# Altium footprint library SparkFun-Retired.PCBLIB: 302 footprints (part 13 of 19)
Each footprint in its own frame and in the unit in brackets; x right, y up, seen from the top. Pads: shape width x height; smd on the part's side, far side on the other; paste and mask are expansions set on the pad; w line width, h text height; cw(c..) or ccw(c..) is an arc to the next point about the centre after c.
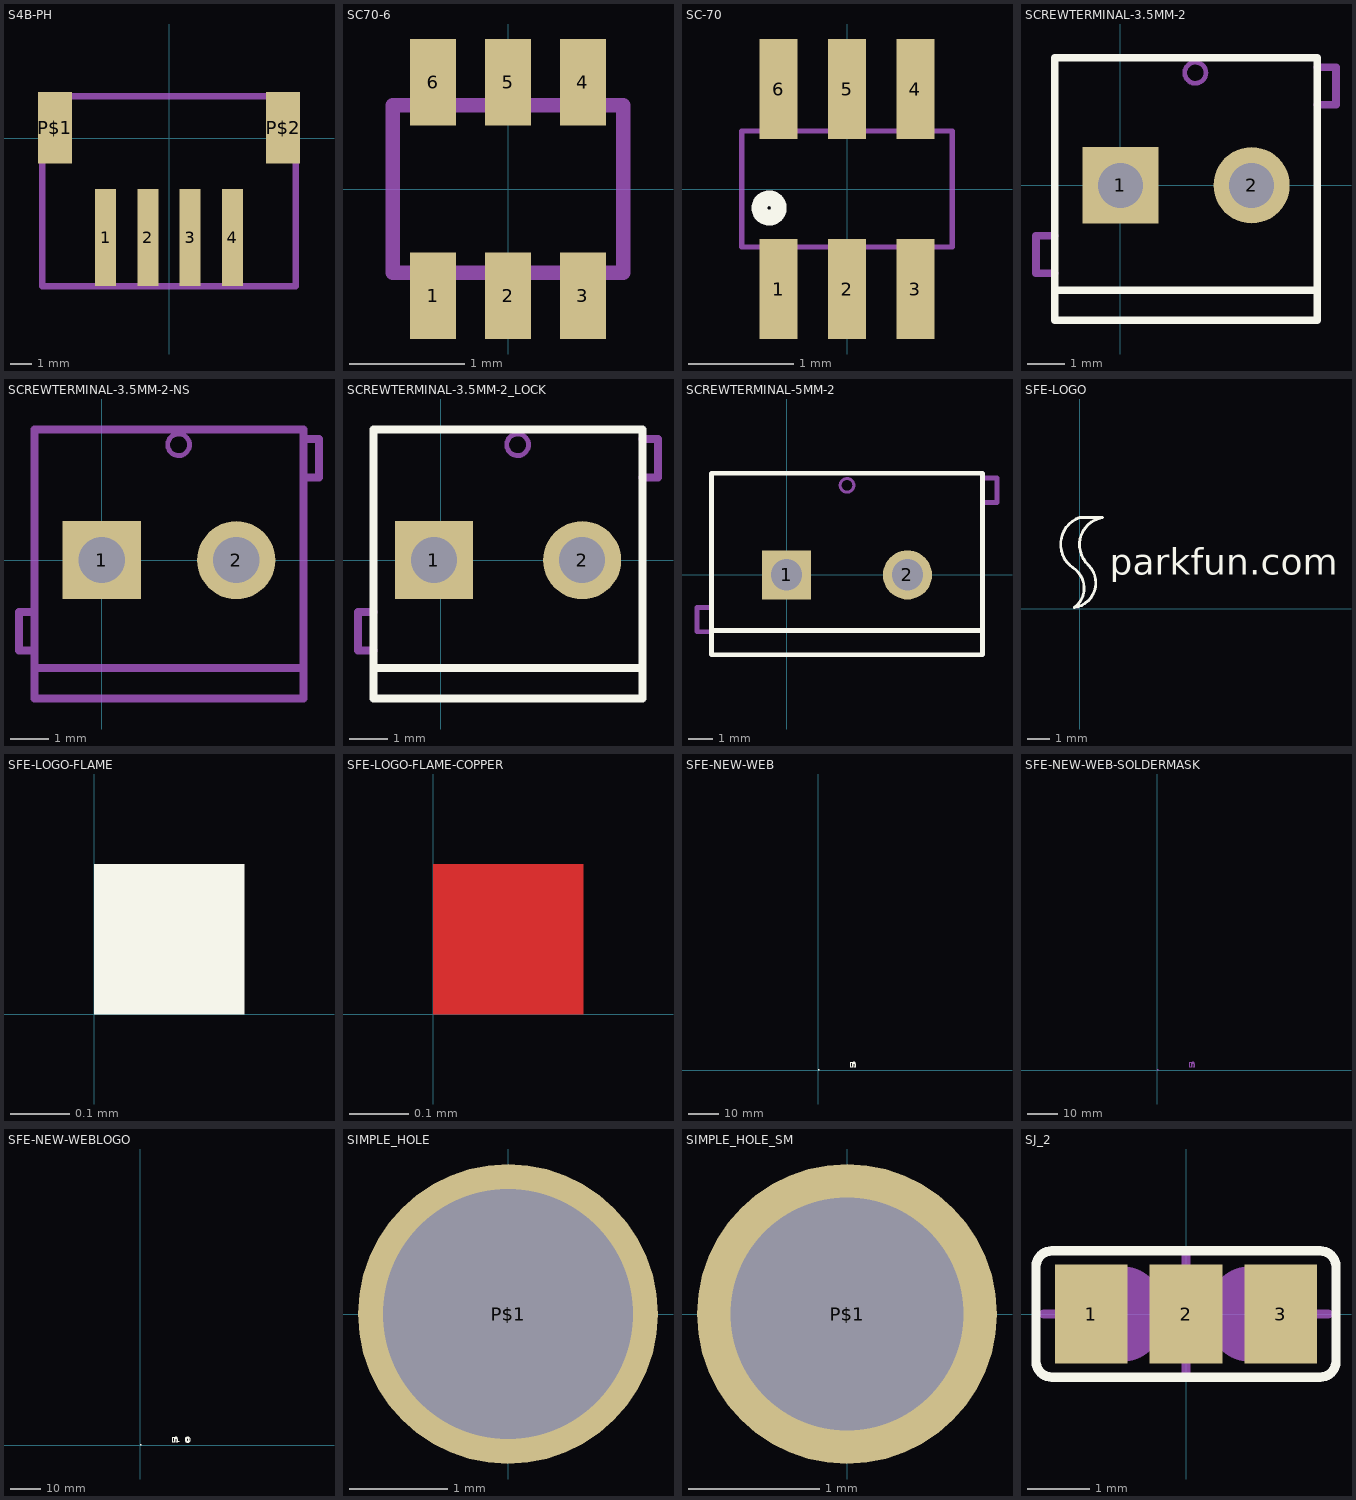
[diagram p12: the footprints below, top view; thin cyan lines are the x and y axes]

## S4B-PH [mm]
pads (6):
  rect 1x4.6 smd: 1(-3,-4.7) 2(-1,-4.7) 3(1,-4.7) 4(3,-4.7)
  rect 1.6x3.4 smd: P$1(-5.4,0.5) P$2(5.4,0.5)
Mechanical 16:
  lines w0.305: -6,-7 -6,2 6,2 6,-7 -6,-7

## SC70-6 [mm]
pads (6):
  rect 0.4x0.75 smd: 1(-0.65,-0.925) 2(0,-0.925) 3(0.65,-0.925) 4(0.65,0.925) 5(0,0.925) 6(-0.65,0.925)
Top Paste:
  rectangle: -0.85,0.55 -0.45,1.3
  rectangle: 0.45,0.55 0.85,1.3
  rectangle: -0.85,-1.3 -0.45,-0.55
  rectangle: -0.2,0.55 0.2,1.3
  rectangle: -0.85,-1.3 -0.45,-0.55
  rectangle: -0.85,-1.3 -0.45,-0.55
  rectangle: -0.201,-1.3 0.199,-0.55
  rectangle: 0.45,-1.3 0.85,-0.55
Mechanical 16:
  lines w0.127: -1,-0.725 -1,0.725 1,0.725 1,-0.725 -1,-0.725

## SC-70 [mm]
pads (6):
  rect 0.36x0.95 smd: 1(-0.65,-0.95) 2(0,-0.95) 3(0.65,-0.95) 4(0.65,0.95) 5(0,0.95) 6(-0.65,0.95)
Top Overlay:
  circle w0.15: c-0.74,-0.18 r0.092
Mechanical 16:
  lines w0.05: -1,-0.55 1,-0.55 1,0.55 -1,0.55 -1,-0.55

## SCREWTERMINAL-3.5MM-2 [mil]
pads (2):
  rect 80x80 hole 47.24: 1(0,0)
  round 80 hole 47.24: 2(137.8,0)
Top Overlay:
  lines w8: -68.9,-110.24 -68.9,-141.73 206.69,-141.73 206.69,-110.24 ; -68.9,-110.24 -68.9,133.86 206.69,133.86 206.69,-110.24 ; -68.9,-110.24 206.69,-110.24
Mechanical 16:
  circle w5: c78.74,118.11 r11.13
  lines w8: -68.9,-92.52 -88.58,-92.52 -88.58,-53.15 -68.9,-53.15 ; 206.69,84.65 226.38,84.65 226.38,124.02 206.69,124.02

## SCREWTERMINAL-3.5MM-2-NS [mil]
pads (2):
  rect 80x80 hole 47.24: 1(0,0)
  round 80 hole 47.24: 2(137.8,0)
Mechanical 16:
  circle w5: c78.74,118.11 r11.13
  lines w8: -68.9,-92.52 -84.65,-92.52 -84.65,-53.15 -68.9,-53.15 ; 206.69,84.65 222.44,84.65 222.44,124.02 206.69,124.02 ; -68.9,-110.24 -68.9,-141.73 206.69,-141.73 206.69,-110.24 ; -68.9,-110.24 -68.9,133.86 206.69,133.86 206.69,-110.24 ; -68.9,-110.24 206.69,-110.24

## SCREWTERMINAL-3.5MM-2_LOCK [mil]
pads (2):
  rect 80x80 hole 47.24: 1(-7,0)
  round 80 hole 47.24: 2(144.8,0)
Top Overlay:
  lines w8: -68.9,-110.24 -68.9,-141.73 206.69,-141.73 206.69,-110.24 ; -68.9,-110.24 -68.9,133.86 206.69,133.86 206.69,-110.24 ; -68.9,-110.24 206.69,-110.24
Mechanical 16:
  circle w5: c78.74,118.11 r11.13
  circle w1: c0,0 r17
  circle w1: c137.8,0 r17
  lines w8: -68.9,-92.52 -84.65,-92.52 -84.65,-53.15 -68.9,-53.15 ; 206.69,84.65 222.44,84.65 222.44,124.02 206.69,124.02

## SCREWTERMINAL-5MM-2 [mil]
pads (2):
  rect 80x80 hole 51.18: 1(0,0)
  round 80 hole 51.18: 2(196.85,0)
Top Overlay:
  lines w8: -122.05,-90.55 -122.05,-129.92 318.9,-129.92 318.9,-90.55 ; -122.05,-90.55 -122.05,165.35 318.9,165.35 318.9,-90.55 ; -122.05,-90.55 318.9,-90.55
Mechanical 16:
  circle w5: c98.43,145.67 r11.13
  lines w8: -122.05,-92.52 -145.67,-92.52 -145.67,-53.15 -122.05,-53.15 ; 318.9,118.11 342.52,118.11 342.52,157.48 318.9,157.48

## SFE-LOGO [mil]
Top Overlay:
  rectangle: -0.79,6.69 0.79,10.24
  lines w5: -11.81,70.87 cw(c16.42,111.13) 0,157.48 39.37,157.48 ccw(c47.49,110.45) 15.75,74.8 cw(c-15.62,44.88) -9.45,1.97 ccw(c-33.76,35.63) -11.81,70.87
  text "parkfun.com" at 51.57,43.31 h77.5

## SFE-LOGO-FLAME [mil]
Top Overlay:
  region: 0,0 10,0 10,10 0,10

## SFE-LOGO-FLAME-COPPER [mil]
Top Layer:
  region: 0,0 10,0 10,10 0,10

## SFE-NEW-WEB [mil]
Top Overlay:
  region: 0,0 10,0 10,10 0,10
  region: 0,0 10,0 10,10 0,10
  region: 0,0 10,0 10,10 0,10
  region: 0,0 10,0 10,10 0,10
  region: 0,0 10,0 10,10 0,10
  region: 0,0 10,0 10,10 0,10
  region: 0,0 10,0 10,10 0,10
  region: 0,0 10,0 10,10 0,10
  region: 0,0 10,0 10,10 0,10
  lines w1: 421.9,37.2 421.9,99.1 437.8,99.1 437.8,90.4 438.1,90.4 ccw(c438.1,91.37) 438.8,90.7 ccw(c434.55,94.75) 439.3,91.3 cw(c610.67,-33.22) 440.4,92.8 cw(c455.22,81.8) 443.8,96.3 cw(c456.25,80.52) 455.4,100.6 cw(c457.86,41.57) 463.3,100.4 cw(c461.73,83.33) 473.8,95.5 cw(c461.46,83.06) 478.3,87.9 cw(c446.15,78.65) 479.6,79.1 479.6,37.6 463.5,37.6 463.5,75.6 ccw(c447.37,75.6) 461.2,83.9 ccw(c453.54,79.31) 456.6,87.7 ccw(c454.3,81.41) 454,88.1 cw(c371.04,1864.8) 449.6,87.9 ccw(c450.05,77.58) 443.3,85.4 ccw(c451.72,75.64) 439.7,80.3 ccw(c456.29,73.87) 438.5,74.1 ccw(c543.84,72.75) 438.5,71.4 438.5,37.2 421.9,37.2

## SFE-NEW-WEB-SOLDERMASK [mil]
Top Solder:
  region: 0,0 10,0 10,10 0,10
  region: 0,0 10,0 10,10 0,10
  region: 0,0 10,0 10,10 0,10
  region: 0,0 10,0 10,10 0,10
  region: 0,0 10,0 10,10 0,10
  region: 0,0 10,0 10,10 0,10
  region: 0,0 10,0 10,10 0,10
  region: 0,0 10,0 10,10 0,10
  region: 0,0 10,0 10,10 0,10
  lines w1: 421.9,37.2 421.9,99.1 437.8,99.1 437.8,90.4 438.1,90.4 ccw(c438.1,91.37) 438.8,90.7 ccw(c434.55,94.75) 439.3,91.3 cw(c610.67,-33.22) 440.4,92.8 cw(c455.22,81.8) 443.8,96.3 cw(c456.25,80.52) 455.4,100.6 cw(c457.86,41.57) 463.3,100.4 cw(c461.73,83.33) 473.8,95.5 cw(c461.46,83.06) 478.3,87.9 cw(c446.15,78.65) 479.6,79.1 479.6,37.6 463.5,37.6 463.5,75.6 ccw(c447.37,75.6) 461.2,83.9 ccw(c453.54,79.31) 456.6,87.7 ccw(c454.3,81.41) 454,88.1 cw(c371.04,1864.8) 449.6,87.9 ccw(c450.05,77.58) 443.3,85.4 ccw(c451.72,75.64) 439.7,80.3 ccw(c456.29,73.87) 438.5,74.1 ccw(c543.84,72.75) 438.5,71.4 438.5,37.2 421.9,37.2

## SFE-NEW-WEBLOGO [mil]
Top Overlay:
  rectangle: 489.2,37.2 508.7,56.3
  region: 0,0 10,0 10,10 0,10
  region: 0,0 10,0 10,10 0,10
  region: 0,0 10,0 10,10 0,10
  region: 0,0 10,0 10,10 0,10
  region: 0,0 10,0 10,10 0,10
  region: 0,0 10,0 10,10 0,10
  region: 0,0 10,0 10,10 0,10
  region: 0,0 10,0 10,10 0,10
  region: 0,0 10,0 10,10 0,10
  region: 0,0 10,0 10,10 0,10
  region: 0,0 10,0 10,10 0,10
  region: 0,0 10,0 10,10 0,10
  region: 0,0 10,0 10,10 0,10
  lines w1: 421.9,37.2 421.9,99.1 437.8,99.1 437.8,90.4 438.1,90.4 ccw(c438.1,91.37) 438.8,90.7 ccw(c434.55,94.75) 439.3,91.3 cw(c610.67,-33.22) 440.4,92.8 cw(c455.22,81.8) 443.8,96.3 cw(c456.25,80.52) 455.4,100.6 cw(c457.86,41.57) 463.3,100.4 cw(c461.73,83.33) 473.8,95.5 cw(c461.46,83.06) 478.3,87.9 cw(c446.15,78.65) 479.6,79.1 479.6,37.6 463.5,37.6 463.5,75.6 ccw(c447.37,75.6) 461.2,83.9 ccw(c453.54,79.31) 456.6,87.7 ccw(c454.3,81.41) 454,88.1 cw(c371.04,1864.8) 449.6,87.9 ccw(c450.05,77.58) 443.3,85.4 ccw(c451.72,75.64) 439.7,80.3 ccw(c456.29,73.87) 438.5,74.1 ccw(c543.84,72.75) 438.5,71.4 438.5,37.2 421.9,37.2 ; 580.8,61.7 ccw(c613.49,67.07) 585.1,50 ccw(c604.68,61.77) 590.2,44.1 ccw(c612.31,71.07) 611.9,36.2 ccw(c612.42,79.8) 626.1,38.4 ccw(c617.79,63.52) 642.4,53.8 ccw(c597.23,71.66) 645.8,71.2 ccw(c614.38,71.49) 635,95.2 ccw(c614.82,71.99) 622.4,101.8 ccw(c613.61,67.21) 613.6,102.9 613,102.9 613,90.4 cw(c613.1,71.3) 619.2,89.4 cw(c615.95,79.74) 623.3,86.8 cw(c608.97,73.05) 628.3,77.6 cw(c587.89,68.1) 629.4,67.7 cw(c602.89,67.94) 626.3,55.5 cw(c615.4,61.29) 620.6,50.1 cw(c612.98,66.47) 607.4,49.3 cw(c611.38,61.57) 600,55.5 cw(c621.05,66.72) 597.3,64.5 cw(c655.46,69.95) 597.2,74.2 cw(c617.88,72.69) 601.5,85.4 cw(c611.3,77.79) 611.3,90.2 612.2,90.2 612.2,102.9 ccw(c613.58,67.65) 595.6,98 ccw(c611.38,71.36) 580.9,76.8 ccw(c624.9,68.96) 580.8,61.7

## SIMPLE_HOLE [mil]
pads (1):
  round 120 hole 100: P$1(0,0)

## SIMPLE_HOLE_SM [mil]
pads (1):
  round 90 hole 70: P$1(0,0)

## SJ_2 [mil]
pads (3):
  rect 46x63 smd: 1(-60,0) 2(0,0) 3(60,0)
Top Overlay:
  lines w6: -95,-30 ccw(c-85,-30) -85,-40 85,-40 ccw(c85,-30) 95,-30 95,30 ccw(c85,30) 85,40 -85,40 ccw(c-85,30) -95,30 -95,-30
Mechanical 16:
  rectangle: -20,-30 20,30
  lines w6: -90,0 -70,0 ; 0,-40 0,-30 ; 0,30 0,40 ; 70,0 90,0
  lines w50: -40,-5 cw(c-40,0) -40,5 ; 40,-5 ccw(c40,0) 40,5